# Altium footprint library LibPCB.PcbLib: 76 footprints (part 5 of 5)
Each footprint in its own frame and in the unit in brackets; x right, y up, seen from the top. Pads: shape width x height; smd on the part's side, far side on the other; paste and mask are expansions set on the pad; w line width, h text height; cw(c..) or ccw(c..) is an arc to the next point about the centre after c.
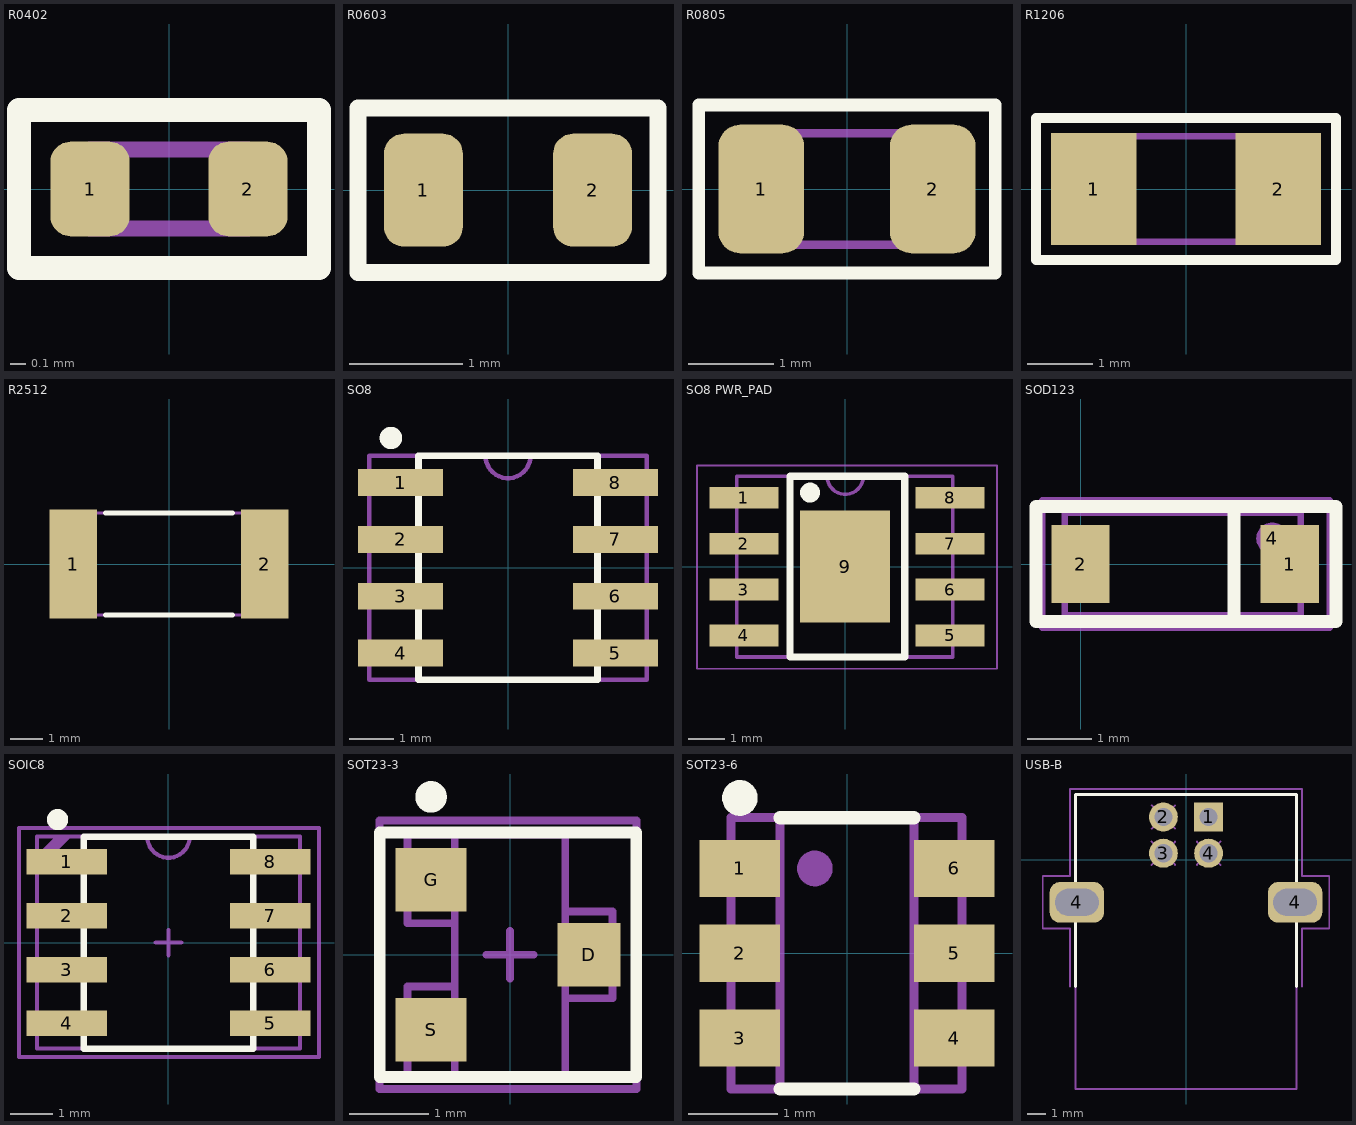
[diagram p4: the footprints below, top view; thin cyan lines are the x and y axes]

## R0402 [mm]
height 0.35
pads (2):
  rrect50% 0.5x0.6 smd: 1(-0.5,0) 2(0.5,0)
Top Overlay:
  lines w0.15: -0.95,-0.5 0.95,-0.5 0.95,0.5 -0.95,0.5 -0.95,-0.5
Mechanical 9:
  text ".Comment" at -0.58,-1.11 h0.6
  text ".Designator" at -0.58,0.75 h0.8
Mechanical 11:
  lines w0.1: -0.5,-0.25 -0.5,0.25 0.5,0.25 0.5,-0.25 -0.5,-0.25
3D body "User Library-User Library-res0402_res0402_body.step": height 0.36, standoff 0, extent -0.495,-0.229 0.495,0.279

## R0603 [mm]
height 0.45
pads (2):
  rrect50% 0.7x1 smd: 1(-0.75,0) 2(0.75,0)
Top Overlay:
  lines w0.15: -1.33,-0.73 1.33,-0.73 1.33,0.73 -1.33,0.73 -1.33,-0.73
Mechanical 9:
  text ".Designator" at -0.975,0 h0.8
  text ".Comment" at 0.25,-0.425 h0.6
Mechanical 11:
  lines w0.1: -1.325,-0.725 -1.325,0.75 1.325,0.75 1.325,-0.725 -1.325,-0.725
3D body "RESC1608.STEP": height 0.5, standoff 0, extent -0.85,-0.4 0.75,0.4

## R0805 [mm]
height 0.5
pads (2):
  rrect50% 1x1.5 smd: 1(-1,0) 2(1,0)
Top Overlay:
  lines w0.15: -1.73,-0.98 -1.73,0.98 1.73,0.98 1.73,-0.98 -1.73,-0.98
Mechanical 9:
  text ".Comment" at -0.56,-1.62 h0.6
  text ".Designator" at -0.47,1.37 h0.8
Mechanical 11:
  lines w0.1: -1.05,-0.65 1.05,-0.65 1.05,0.65 -1.05,0.65 -1.05,-0.65
3D body "User Library-R SMD 0805.STEP": height 0.57, standoff 0.12, extent -1.049,-0.65 0.951,0.6

## R1206 [mm]
height 0.55
pads (2):
  rect 1.3x1.7 smd: 1(-1.4,0) 2(1.4,0)
Top Overlay:
  lines w0.15: -2.28,-1.08 -2.28,1.08 2.28,1.08 2.28,-1.08 -2.28,-1.08
Mechanical 9:
  text ".Designator" at -1,0 h0.8
  text ".Comment" at -0.5,-0.5 h0.6
Mechanical 11:
  lines w0.1: -1.55,-0.8 1.55,-0.8 1.55,0.8 -1.55,0.8 -1.55,-0.8
3D body "User Library-R1206.step": height 0.47, standoff 0, extent -1.55,-0.776 1.55,0.776

## R2512 [mm]
height 0.55
pads (2):
  rect 1.5x3.4 smd: 1(-3,0) 2(3,0)
Top Overlay:
  lines w0.15: -2,-1.6 2,-1.6 ; -2,1.6 2,1.6
Mechanical 9:
  text ".Designator" at -1.6,0.55 h0.8
  text ".Comment" at -0.35,-1 h0.6
Mechanical 11:
  lines w0.1: -3.175,-1.6 -3.175,1.6 3.175,1.6 3.175,-1.6 -3.175,-1.6
3D body "User Library-R SMD 2512.STEP": height 0.82, standoff 0.22, extent -3.231,-1.55 3.069,1.6

## SO8 [mm]
height 1.75
pads (8):
  rect 1.9x0.6 smd: 1(-2.4,1.905) 2(-2.4,0.635) 3(-2.4,-0.635) 4(-2.4,-1.905) 5(2.4,-1.905) 6(2.4,-0.635) 7(2.4,0.635) 8(2.4,1.905)
Top Overlay:
  circle w0.25: c-2.615,2.9 r0.125
  lines w0.15: -2,-2.5 2,-2.5 2,2.5 -2,2.5 ; -2,-2.475 -2,2.475
Mechanical 9:
  text ".Comment" at -0.69,-3.25 h0.6
  text ".Designator" at -1,3.02 h0.8
Mechanical 11:
  lines w0.1: -2,-2.5 -2,2.5 ; -0.5,2.5 ccw(c0,2.5) 0.5,2.5 ; 2,-2.5 2,2.5 ; -3.1,-2.5 3.1,-2.5 3.1,2.5 -3.1,2.5 -3.1,-2.5
3D body "SOIC-8.STEP": height 1.7, standoff 0, extent -3,-2.54 3,2.54

## SO8 PWR_PAD [mm]
pads (9):
  rect 1.9x0.6 smd: 1(-2.8,1.905) 2(-2.8,0.635) 3(-2.8,-0.635) 4(-2.8,-1.905) 5(2.9,-1.905) 6(2.9,-0.635) 7(2.9,0.635) 8(2.9,1.905)
  rect 2.49x3.1 smd: 9(0,0)
Top Overlay:
  circle w0.3: c-0.975,2.05 r0.125
  lines w0.2: -1.525,-2.5 1.65,-2.5 1.65,2.5 -1.525,2.5 -1.525,-2.5
Mechanical 9:
  text ".Designator" at -1,3.02 h0.8
  text ".Comment" at -0.69,-3.25 h0.6
Mechanical 11:
  lines w0.1: -0.5,2.5 ccw(c0,2.5) 0.5,2.5 ; -3,-2.5 -3,2.5 2.975,2.5 2.975,-2.5 -3,-2.5
Mechanical 15:
  lines w0.05: -1,0 1,0 ; 0,-1 0,1 ; -4.1,-2.825 4.2,-2.825 4.2,2.8 -4.1,2.8 -4.1,2.1 -4.1,-2.825
3D body "SOIC-8.STEP": height 1.7, standoff 0, extent -3,-2.54 3,2.54

## SOD123 [mm]
pads (3):
  rect 0.91x1.22 smd: 1(3.275,0) 2(0,0)
  round 0.5 on Mech1: 4(3,0.4)
Top Overlay:
  lines w0.2: 2.4,-0.9 2.4,0.9 ; -0.7,-0.9 4,-0.9 4,0.9 -0.7,0.9 -0.7,-0.9
Mechanical 1:
  lines w0.1: -0.249,-0.8 3.449,-0.8 3.449,0.8 -0.249,0.8 -0.249,-0.8
Mechanical 9:
  text ".Designator" at 0.07,0.049 h0.8
  text ".Comment" at 0.47,-0.651 h0.6
Mechanical 11:
  lines w0.1: 2.413,-1 2.413,1 ; -0.6,-1 -0.6,1 3.9,1 3.9,-1 -0.6,-1
3D body "User Library-SOD-123.STEP": height 1.25, standoff 0, extent -0.249,-0.8 3.449,0.8

## SOIC8 [mm]
height 1.75
pads (8):
  rect 1.9x0.6 smd: 1(-2.4,1.905) 2(-2.4,0.635) 3(-2.4,-0.635) 4(-2.4,-1.905) 5(2.4,-1.905) 6(2.4,-0.635) 7(2.4,0.635) 8(2.4,1.905)
Top Overlay:
  circle w0.25: c-2.615,2.9 r0.125
  lines w0.15: -2,-2.5 2,-2.5 2,2.5 -2,2.5 ; -2,-2.475 -2,2.475
Mechanical 9:
  text ".Comment" at -0.9,2.7 h0.6
  text ".Designator" at -1.3,3.4 h0.8
Mechanical 11:
  lines w0.1: -3.075,1.975 -2.575,2.475 -2.625,2.475 -3.075,2.025 ; -2.913,2.05 -3.1,1.75 ; -2.5,2.5 -3.1,1.9 ; -2,-2.5 -2,2.5 ; -0.5,2.5 ccw(c0,2.5) 0.5,2.5 ; 2,-2.5 2,2.5 ; -3.1,1.75 -3.1,1.9 ; -3.1,1.75 -2.35,2.5 -3.1,1.9 ; -3.1,-2.5 3.1,-2.5 3.1,2.5 -3.1,2.5 -3.1,-2.5
Mechanical 15:
  lines w0.1: -0.3,0 0,0 ; 0,-0.3 0,0 ; 0,0.3 0,0 ; 0.3,0 0,0 ; -3.525,-2.7 3.55,-2.7 3.55,2.7 -3.525,2.7 -3.525,-2.7
3D body "SOIC-8.STEP": height 1.7, standoff 0, extent -3,-2.54 3,2.54

## SOT23-3 [mm]
height 1.12
pads (3):
  rect 0.8x0.8 smd: D(1,0)
  rect 0.9x0.8 smd: G(-1,0.95) S(-1,-0.95)
Top Overlay:
  circle w0.2: c-1,2 r0.1
  lines w0.15: -1.65,-1.55 1.6,-1.55 1.6,1.55 -1.65,1.55 -1.65,-1.55
Mechanical 9:
  text ".Designator" at -0.9,2.6 h0.8
  text ".Comment" at -0.5,1.9 h0.6
Mechanical 11:
  lines w0.1: -0.7,-1.52 -0.7,1.52 ; -0.7,-0.4 -1.3,-0.4 -1.3,-1.52 0.7,-1.52 0.7,1.52 -1.3,1.52 -1.3,0.4 -0.7,0.4 ; 0.7,-0.55 1.3,-0.55 1.3,0.55 0.7,0.55
Mechanical 15:
  lines w0.1: -0.3,0 0,0 ; 0,-0.3 0,0 ; 0,0.3 0,0 ; 0.3,0 0,0 ; -1.651,-1.7 -1.651,1.7 1.6,1.7 1.6,-1.7 -1.651,-1.7
3D body "SOT-23-3.STEP": height 1.1, standoff 0, extent -1.15,-1.5 1.15,1.5

## SOT23-6 [mm]
height 1.12
pads (6):
  rect 0.9x0.64 smd: 1(-1.2,0.95) 2(-1.2,0) 3(-1.2,-0.95) 4(1.2,-0.95) 5(1.2,0) 6(1.2,0.95)
Top Overlay:
  circle w0.2: c-1.2,1.74 r0.1
  lines w0.15: -0.75,-1.52 0.75,-1.52 ; -0.75,1.52 0.75,1.52
Mechanical 9:
  text ".Comment" at 0.1,-2.1 h0.7
  text ".Designator" at 0,1.8 h0.7
Mechanical 11:
  circle w0.2: c-0.36,0.95 r0.1
  lines w0.1: -0.75,-1.52 -0.75,1.52 ; 0.75,-1.52 0.75,1.52 ; -1.3,-1.52 -1.3,1.52 1.29,1.52 1.29,-1.52 -1.3,-1.52
3D body "SW3dPS-SOT-23-6.STEP": height 1.09, standoff 0, extent -1.126,-1.397 1.3,1.397

## USB-B [mm]
pads (6):
  rect 1.6x1.6 hole 1: 1(1.25,2.355)
  round 1.6 hole 1: 2(-1.25,2.355) 3(-1.25,0.355) 4(1.25,0.355)
  rrect50% 3x2.25 hole 1.5 slot 2.4 at 0 deg: 4(-6.02,-2.355) 4(6.02,-2.355)
Top Overlay:
  lines w0.15: -6.1,-7 -6.1,3.6 6.1,3.6 6.1,-7
Mechanical 9:
  text ".Comment" at -1.22,4.445 h0.6
  text ".Designator" at -1.62,5.145 h0.8
Mechanical 11:
  lines w0.1: -7.22,-3.255 -6.02,-2.355 ; -7.22,-1.455 -6.02,-2.355 ; -4.82,-3.255 -6.02,-2.355 ; -4.82,-1.455 -6.02,-2.355 ; -1.9,-0.29 -1.25,0.355 ; -1.9,1 -1.25,0.355 ; -1.9,1.71 -1.25,2.355 ; -1.9,3 -1.25,2.355 ; -0.6,-0.29 -1.25,0.355 ; -0.6,1 -1.25,0.355 ; -0.6,1.71 -1.25,2.355 ; -0.6,3 -1.25,2.355 ; 0.6,-0.29 1.25,0.355 ; 0.6,1 1.25,0.355 ; 1.9,-0.29 1.25,0.355 ; 1.9,1 1.25,0.355 ; 4.78,-3.255 5.98,-2.355 ; 4.78,-1.455 5.98,-2.355 ; 7.18,-3.255 5.98,-2.355 ; 7.18,-1.455 5.98,-2.355 ; 0.6,1.71 0.6,3 ; 0.6,1.71 1.9,1.71 ; 0.6,1.71 1.25,2.355 ; 0.6,3 1.9,3 ; 0.6,3 1.25,2.355 ; 1.25,2.355 1.9,1.71 ; 1.25,2.355 1.9,3 ; 1.9,1.71 1.9,3 ; -6.1,-12.655 6.1,-12.655 6.1,3.6 -6.1,3.6 -6.1,-12.655
Mechanical 15:
  lines w0.1: -6.4,-7 -6.4,-3.8 -7.9,-3.8 -7.9,-0.9 -6.4,-0.9 -6.4,1.9 -6.4,3.9 6.4,3.9 6.4,1.9 6.4,-0.9 7.9,-0.9 7.9,-3.8 6.4,-3.8 6.4,-7
3D body "User Library-Samtec - USB-B-S-X-W-TH.STEP": height 11, standoff -3.64, extent -7.42,-12.655 7.379,3.845